# Altium schematic symbol library SCHLIB.SchLib: 2608 symbols (part 19 of 20)
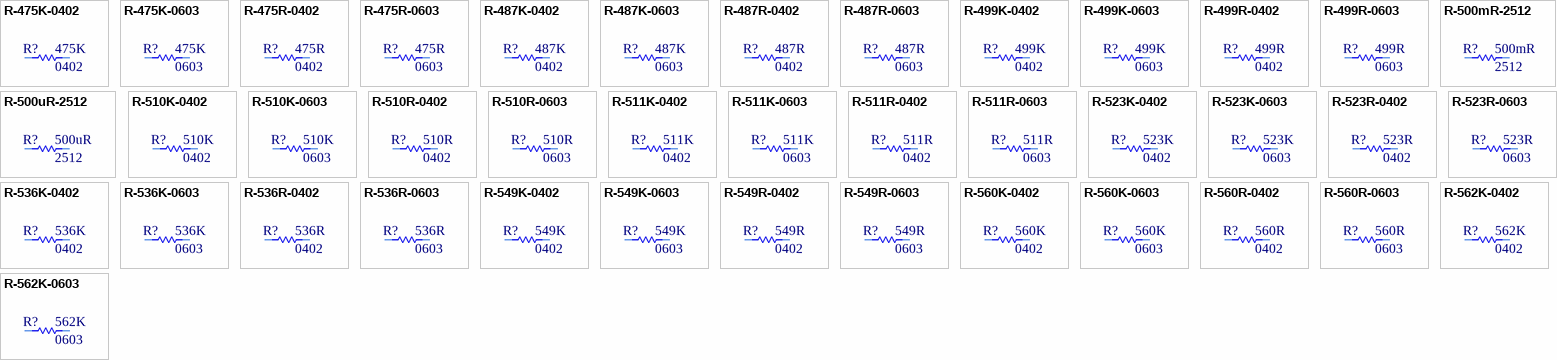
[diagram p101: symbols R-475K-0402 to R-562K-0603]

## R-511R-0603
designator R?, comment Package: 0603  (hidden comment: 511R)
RES SMD 511 OHM 1% 1/10W 0603; Manufacturer Part Number: CRCW0603511RFKEA; Manufacturer: Vishay Dale; Tolerance: 0.01; Power: 0.1W; Temperature Coefficient: ±100ppm/°C; Object  Type: Part; Design Item ID: R-511R-0603; Value: 511R; Composition: Thick Film; Features: Automotive AEC-Q200; Operating Temperature: -55°C ~ 155°C; Height - Seated (Max): 0.50mm; Category: Resistor
footprint R0603
pins: 1, 2

## R-523K-0402
designator R?, comment Package: 0402  (hidden comment: 523K)
RES 523K OHM 1% 1/16W 0402; Manufacturer Part Number: RC0402FR-07523KL; Manufacturer: YAGEO; Tolerance: 0.01; Power: 0.063W; Temperature Coefficient: ±100ppm/°C; Object  Type: Part; Design Item ID: R-523K-0402; Value: 523K; Composition: Thick Film; Features: Moisture Resistant; Operating Temperature: -55°C ~ 155°C; Height - Seated (Max): 0.40mm; Category: Resistor
footprint R0402
pins: 1, 2

## R-523K-0603
designator R?, comment Package: 0603  (hidden comment: 523K)
RES SMD 523K OHM 1% 1/10W 0603; Manufacturer Part Number: CRCW0603523KFKEA; Manufacturer: Vishay Dale; Tolerance: 0.01; Power: 0.1W; Temperature Coefficient: ±100ppm/°C; Object  Type: Part; Design Item ID: R-523K-0603; Value: 523K; Composition: Thick Film; Features: Automotive AEC-Q200; Operating Temperature: -55°C ~ 155°C; Height - Seated (Max): 0.50mm; Category: Resistor
footprint R0603
pins: 1, 2

## R-523R-0402
designator R?, comment Package: 0402  (hidden comment: 523R)
RES 523 OHM 1% 1/16W 0402; Manufacturer Part Number: RC0402FR-07523RL; Manufacturer: YAGEO; Tolerance: 0.01; Power: 0.063W; Temperature Coefficient: ±100ppm/°C; Object  Type: Part; Design Item ID: R-523R-0402; Value: 523R; Composition: Thick Film; Features: Moisture Resistant; Operating Temperature: -55°C ~ 155°C; Height - Seated (Max): 0.40mm; Category: Resistor
footprint R0402
pins: 1, 2

## R-523R-0603
designator R?, comment Package: 0603  (hidden comment: 523R)
RES SMD 523 OHM 1% 1/10W 0603; Manufacturer Part Number: CRCW0603523RFKEA; Manufacturer: Vishay Dale; Tolerance: 0.01; Power: 0.1W; Temperature Coefficient: ±100ppm/°C; Object  Type: Part; Design Item ID: R-523R-0603; Value: 523R; Composition: Thick Film; Features: Automotive AEC-Q200; Operating Temperature: -55°C ~ 155°C; Height - Seated (Max): 0.50mm; Category: Resistor
footprint R0603
pins: 1, 2

## R-536K-0402
designator R?, comment Package: 0402  (hidden comment: 536K)
RES 536K OHM 1% 1/16W 0402; Manufacturer Part Number: RC0402FR-07536KL; Manufacturer: YAGEO; Tolerance: 0.01; Power: 0.063W; Temperature Coefficient: ±100ppm/°C; Object  Type: Part; Design Item ID: R-536K-0402; Value: 536K; Composition: Thick Film; Features: Moisture Resistant; Operating Temperature: -55°C ~ 155°C; Height - Seated (Max): 0.40mm; Category: Resistor
footprint R0402
pins: 1, 2

## R-536K-0603
designator R?, comment Package: 0603  (hidden comment: 536K)
RES SMD 536K OHM 1% 1/10W 0603; Manufacturer Part Number: CRCW0603536KFKEA; Manufacturer: Vishay Dale; Tolerance: 0.01; Power: 0.1W; Temperature Coefficient: ±100ppm/°C; Object  Type: Part; Design Item ID: R-536K-0603; Value: 536K; Composition: Thick Film; Features: Automotive AEC-Q200; Operating Temperature: -55°C ~ 155°C; Height - Seated (Max): 0.50mm; Category: Resistor
footprint R0603
pins: 1, 2

## R-536R-0402
designator R?, comment Package: 0402  (hidden comment: 536R)
RES 536 OHM 1% 1/16W 0402; Manufacturer Part Number: RC0402FR-07536RL; Manufacturer: YAGEO; Tolerance: 0.01; Power: 0.063W; Temperature Coefficient: ±100ppm/°C; Object  Type: Part; Design Item ID: R-536R-0402; Value: 536R; Composition: Thick Film; Features: Moisture Resistant; Operating Temperature: -55°C ~ 155°C; Height - Seated (Max): 0.40mm; Category: Resistor
footprint R0402
pins: 1, 2

## R-536R-0603
designator R?, comment Package: 0603  (hidden comment: 536R)
RES SMD 536 OHM 1% 1/10W 0603; Manufacturer Part Number: CRCW0603536RFKEA; Manufacturer: Vishay Dale; Tolerance: 0.01; Power: 0.1W; Temperature Coefficient: ±100ppm/°C; Object  Type: Part; Design Item ID: R-536R-0603; Value: 536R; Composition: Thick Film; Features: Automotive AEC-Q200; Operating Temperature: -55°C ~ 155°C; Height - Seated (Max): 0.50mm; Category: Resistor
footprint R0603
pins: 1, 2

## R-549K-0402
designator R?, comment Package: 0402  (hidden comment: 549K)
RES 549K OHM 1% 1/16W 0402; Manufacturer Part Number: RC0402FR-07549KL; Manufacturer: YAGEO; Tolerance: 0.01; Power: 0.063W; Temperature Coefficient: ±100ppm/°C; Object  Type: Part; Design Item ID: R-549K-0402; Value: 549K; Composition: Thick Film; Features: Moisture Resistant; Operating Temperature: -55°C ~ 155°C; Height - Seated (Max): 0.40mm; Category: Resistor
footprint R0402
pins: 1, 2

## R-549K-0603
designator R?, comment Package: 0603  (hidden comment: 549K)
RES SMD 549K OHM 1% 1/10W 0603; Manufacturer Part Number: CRCW0603549KFKEA; Manufacturer: Vishay Dale; Tolerance: 0.01; Power: 0.1W; Temperature Coefficient: ±100ppm/°C; Object  Type: Part; Design Item ID: R-549K-0603; Value: 549K; Composition: Thick Film; Features: Automotive AEC-Q200; Operating Temperature: -55°C ~ 155°C; Height - Seated (Max): 0.50mm; Category: Resistor
footprint R0603
pins: 1, 2

## R-549R-0402
designator R?, comment Package: 0402  (hidden comment: 549R)
RES 549 OHM 1% 1/16W 0402; Manufacturer Part Number: RC0402FR-07549RL; Manufacturer: YAGEO; Tolerance: 0.01; Power: 0.063W; Temperature Coefficient: ±100ppm/°C; Object  Type: Part; Design Item ID: R-549R-0402; Composition: Thick Film; Features: Moisture Resistant; Operating Temperature: -55°C ~ 155°C; Height - Seated (Max): 0.40mm; Category: Resistor; Value: 549R
footprint R0402
pins: 1, 2

## R-549R-0603
designator R?, comment Package: 0603  (hidden comment: 549R)
RES SMD 549 OHM 1% 1/10W 0603; Manufacturer Part Number: CRCW0603549RFKEA; Manufacturer: Vishay Dale; Tolerance: 0.01; Power: 0.1W; Temperature Coefficient: ±100ppm/°C; Object  Type: Part; Design Item ID: R-549R-0603; Value: 549R; Composition: Thick Film; Features: Automotive AEC-Q200; Operating Temperature: -55°C ~ 155°C; Height - Seated (Max): 0.50mm; Category: Resistor
footprint R0603
pins: 1, 2

## R-560K-0402
designator R?, comment Package: 0402  (hidden comment: 560K)
RES 560K OHM 1% 1/16W 0402; Manufacturer Part Number: RC0402FR-07560KL; Manufacturer: YAGEO; Tolerance: 0.01; Power: 0.063W; Temperature Coefficient: ±100ppm/°C; Object  Type: Part; Design Item ID: R-560K-0402; Value: 560K; Composition: Thick Film; Features: Moisture Resistant; Operating Temperature: -55°C ~ 155°C; Height - Seated (Max): 0.40mm; Category: Resistor
footprint R0402
pins: 1, 2

## R-560K-0603
designator R?, comment Package: 0603  (hidden comment: 560K)
RES SMD 560K OHM 1% 1/10W 0603; Manufacturer Part Number: CRCW0603560KFKEA; Manufacturer: Vishay Dale; Tolerance: 0.01; Power: 0.1W; Temperature Coefficient: ±100ppm/°C; Object  Type: Part; Design Item ID: R-560K-0603; Value: 560K; Composition: Thick Film; Features: Automotive AEC-Q200; Operating Temperature: -55°C ~ 155°C; Height - Seated (Max): 0.50mm; Category: Resistor
footprint R0603
pins: 1, 2

## R-560R-0402
designator R?, comment Package: 0402  (hidden comment: 560R)
RES 560 OHM 1% 1/16W 0402; Manufacturer Part Number: RC0402FR-07560RL; Manufacturer: YAGEO; Tolerance: 0.01; Power: 0.063W; Temperature Coefficient: ±100ppm/°C; Object  Type: Part; Design Item ID: R-560R-0402; Value: 560R; Composition: Thick Film; Features: Moisture Resistant; Operating Temperature: -55°C ~ 155°C; Height - Seated (Max): 0.40mm; Category: Resistor
footprint R0402
pins: 1, 2

## R-560R-0603
designator R?, comment Package: 0603  (hidden comment: 560R)
RES SMD 560 OHM 1% 1/10W 0603; Manufacturer Part Number: CRCW0603560RFKEA; Manufacturer: Vishay Dale; Tolerance: 0.01; Power: 0.1W; Temperature Coefficient: ±100ppm/°C; Object  Type: Part; Design Item ID: R-560R-0603; Value: 560R; Composition: Thick Film; Features: Automotive AEC-Q200; Operating Temperature: -55°C ~ 155°C; Height - Seated (Max): 0.50mm; Category: Resistor
footprint R0603
pins: 1, 2

## R-562K-0402
designator R?, comment Package: 0402  (hidden comment: 562K)
RES 562K OHM 1% 1/16W 0402; Manufacturer Part Number: RC0402FR-07562KL; Manufacturer: YAGEO; Tolerance: 0.01; Power: 0.063W; Temperature Coefficient: ±100ppm/°C; Object  Type: Part; Design Item ID: R-562K-0402; Value: 562K; Composition: Thick Film; Features: Moisture Resistant; Operating Temperature: -55°C ~ 155°C; Height - Seated (Max): 0.40mm; Category: Resistor
footprint R0402
pins: 1, 2

## R-562K-0603
designator R?, comment Package: 0603  (hidden comment: 562K)
RES SMD 562K OHM 1% 1/10W 0603; Manufacturer Part Number: CRCW0603562KFKEA; Manufacturer: Vishay Dale; Tolerance: 0.01; Power: 0.1W; Temperature Coefficient: ±100ppm/°C; Object  Type: Part; Design Item ID: R-562K-0603; Value: 562K; Composition: Thick Film; Features: Automotive AEC-Q200; Operating Temperature: -55°C ~ 155°C; Height - Seated (Max): 0.50mm; Category: Resistor
footprint R0603
pins: 1, 2

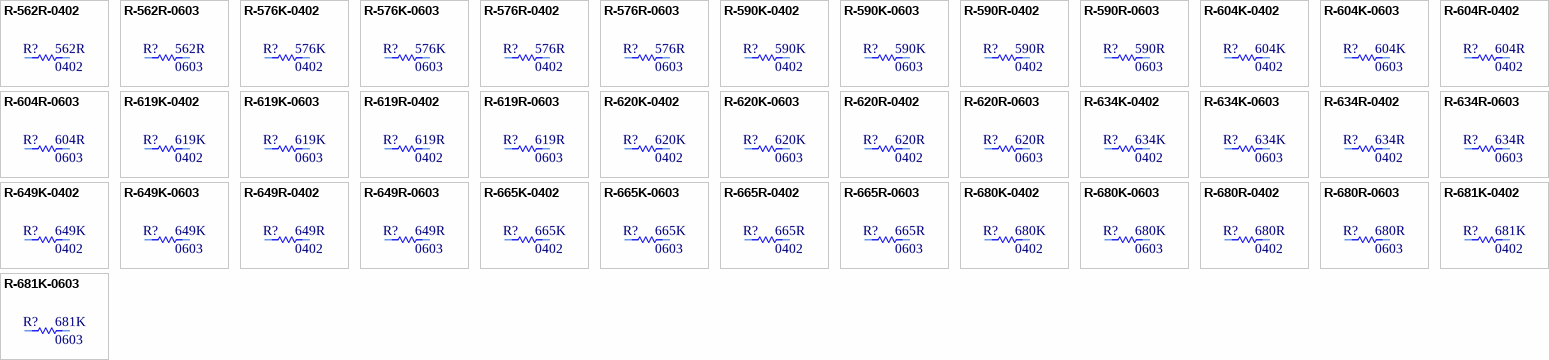
[diagram p79: symbols R-562R-0402 to R-681K-0603]

## R-562R-0402
designator R?, comment Package: 0402  (hidden comment: 562R)
RES 562 OHM 1% 1/16W 0402; Manufacturer Part Number: RC0402FR-07562RL; Manufacturer: YAGEO; Tolerance: 0.01; Power: 0.063W; Temperature Coefficient: ±100ppm/°C; Object  Type: Part; Design Item ID: R-562R-0402; Value: 562R; Composition: Thick Film; Features: Moisture Resistant; Operating Temperature: -55°C ~ 155°C; Height - Seated (Max): 0.40mm; Category: Resistor
footprint R0402
pins: 1, 2

## R-562R-0603
designator R?, comment Package: 0603  (hidden comment: 562R)
RES SMD 562 OHM 1% 1/10W 0603; Manufacturer Part Number: CRCW0603562RFKEA; Manufacturer: Vishay Dale; Tolerance: 0.01; Power: 0.1W; Temperature Coefficient: ±100ppm/°C; Object  Type: Part; Design Item ID: R-562R-0603; Value: 562R; Composition: Thick Film; Features: Automotive AEC-Q200; Operating Temperature: -55°C ~ 155°C; Height - Seated (Max): 0.50mm; Category: Resistor
footprint R0603
pins: 1, 2

## R-576K-0402
designator R?, comment Package: 0402  (hidden comment: 576K)
RES 576K OHM 1% 1/16W 0402; Manufacturer Part Number: RC0402FR-07576KL; Manufacturer: YAGEO; Tolerance: 0.01; Power: 0.063W; Temperature Coefficient: ±100ppm/°C; Object  Type: Part; Design Item ID: R-576K-0402; Value: 576K; Composition: Thick Film; Features: Moisture Resistant; Operating Temperature: -55°C ~ 155°C; Height - Seated (Max): 0.40mm; Category: Resistor
footprint R0402
pins: 1, 2

## R-576K-0603
designator R?, comment Package: 0603  (hidden comment: 576K)
RES SMD 576K OHM 1% 1/10W 0603; Manufacturer Part Number: CRCW0603576KFKEA; Manufacturer: Vishay Dale; Tolerance: 0.01; Power: 0.1W; Temperature Coefficient: ±100ppm/°C; Object  Type: Part; Design Item ID: R-576K-0603; Value: 576K; Composition: Thick Film; Features: Automotive AEC-Q200; Operating Temperature: -55°C ~ 155°C; Height - Seated (Max): 0.50mm; Category: Resistor
footprint R0603
pins: 1, 2

## R-576R-0402
designator R?, comment Package: 0402  (hidden comment: 576R)
RES 576 OHM 1% 1/16W 0402; Manufacturer Part Number: RC0402FR-07576RL; Manufacturer: YAGEO; Tolerance: 0.01; Power: 0.063W; Temperature Coefficient: ±100ppm/°C; Object  Type: Part; Design Item ID: R-576R-0402; Value: 576R; Composition: Thick Film; Features: Moisture Resistant; Operating Temperature: -55°C ~ 155°C; Height - Seated (Max): 0.40mm; Category: Resistor
footprint R0402
pins: 1, 2

## R-576R-0603
designator R?, comment Package: 0603  (hidden comment: 576R)
RES SMD 576 OHM 1% 1/10W 0603; Manufacturer Part Number: CRCW0603576RFKEA; Manufacturer: Vishay Dale; Tolerance: 0.01; Power: 0.1W; Temperature Coefficient: ±100ppm/°C; Object  Type: Part; Design Item ID: R-576R-0603; Value: 576R; Composition: Thick Film; Features: Automotive AEC-Q200; Operating Temperature: -55°C ~ 155°C; Height - Seated (Max): 0.50mm; Category: Resistor
footprint R0603
pins: 1, 2

## R-590K-0402
designator R?, comment Package: 0402  (hidden comment: 590K)
RES 590K OHM 1% 1/16W 0402; Manufacturer Part Number: RC0402FR-07590KL; Manufacturer: YAGEO; Tolerance: 0.01; Power: 0.063W; Temperature Coefficient: ±100ppm/°C; Object  Type: Part; Design Item ID: R-590K-0402; Value: 590K; Composition: Thick Film; Features: Moisture Resistant; Operating Temperature: -55°C ~ 155°C; Height - Seated (Max): 0.40mm; Category: Resistor
footprint R0402
pins: 1, 2

## R-590K-0603
designator R?, comment Package: 0603  (hidden comment: 590K)
RES SMD 590K OHM 1% 1/10W 0603; Manufacturer Part Number: CRCW0603590KFKEA; Manufacturer: Vishay Dale; Tolerance: 0.01; Power: 0.1W; Temperature Coefficient: ±100ppm/°C; Object  Type: Part; Design Item ID: R-590K-0603; Value: 590K; Composition: Thick Film; Features: Automotive AEC-Q200; Operating Temperature: -55°C ~ 155°C; Height - Seated (Max): 0.50mm; Category: Resistor
footprint R0603
pins: 1, 2

## R-590R-0402
designator R?, comment Package: 0402  (hidden comment: 590R)
RES 590 OHM 1% 1/16W 0402; Manufacturer Part Number: RC0402FR-07590RL; Manufacturer: YAGEO; Tolerance: 0.01; Power: 0.063W; Temperature Coefficient: ±100ppm/°C; Object  Type: Part; Design Item ID: R-590R-0402; Value: 590R; Composition: Thick Film; Features: Moisture Resistant; Operating Temperature: -55°C ~ 155°C; Height - Seated (Max): 0.40mm; Category: Resistor
footprint R0402
pins: 1, 2

## R-590R-0603
designator R?, comment Package: 0603  (hidden comment: 590R)
RES SMD 590 OHM 1% 1/10W 0603; Manufacturer Part Number: CRCW0603590RFKEA; Manufacturer: Vishay Dale; Tolerance: 0.01; Power: 0.1W; Temperature Coefficient: ±100ppm/°C; Object  Type: Part; Design Item ID: R-590R-0603; Value: 590R; Composition: Thick Film; Features: Automotive AEC-Q200; Operating Temperature: -55°C ~ 155°C; Height - Seated (Max): 0.50mm; Category: Resistor
footprint R0603
pins: 1, 2

## R-604K-0402
designator R?, comment Package: 0402  (hidden comment: 604K)
RES 604K OHM 1% 1/16W 0402; Manufacturer Part Number: RC0402FR-07604KL; Manufacturer: YAGEO; Tolerance: 0.01; Power: 0.063W; Temperature Coefficient: ±100ppm/°C; Object  Type: Part; Design Item ID: R-604K-0402; Composition: Thick Film; Features: Moisture Resistant; Operating Temperature: -55°C ~ 155°C; Height - Seated (Max): 0.40mm; Category: Resistor; Value: 604K
footprint R0402
pins: 1, 2

## R-604K-0603
designator R?, comment Package: 0603  (hidden comment: 604K)
RES SMD 604K OHM 1% 1/10W 0603; Manufacturer Part Number: CRCW0603604KFKEA; Manufacturer: Vishay Dale; Tolerance: 0.01; Power: 0.1W; Temperature Coefficient: ±100ppm/°C; Object  Type: Part; Design Item ID: R-604K-0603; Value: 604K; Composition: Thick Film; Features: Automotive AEC-Q200; Operating Temperature: -55°C ~ 155°C; Height - Seated (Max): 0.50mm; Category: Resistor
footprint R0603
pins: 1, 2

## R-604R-0402
designator R?, comment Package: 0402  (hidden comment: 604R)
RES 604 OHM 1% 1/16W 0402; Manufacturer Part Number: RC0402FR-07604RL; Manufacturer: YAGEO; Tolerance: 0.01; Power: 0.063W; Temperature Coefficient: ±100ppm/°C; Object  Type: Part; Design Item ID: R-604R-0402; Value: 604R; Composition: Thick Film; Features: Moisture Resistant; Operating Temperature: -55°C ~ 155°C; Height - Seated (Max): 0.40mm; Category: Resistor
footprint R0402
pins: 1, 2

## R-604R-0603
designator R?, comment Package: 0603  (hidden comment: 604R)
RES SMD 604 OHM 1% 1/10W 0603; Manufacturer Part Number: CRCW0603604RFKEA; Manufacturer: Vishay Dale; Tolerance: 0.01; Power: 0.1W; Temperature Coefficient: ±100ppm/°C; Object  Type: Part; Design Item ID: R-604R-0603; Value: 604R; Composition: Thick Film; Features: Automotive AEC-Q200; Operating Temperature: -55°C ~ 155°C; Height - Seated (Max): 0.50mm; Category: Resistor
footprint R0603
pins: 1, 2

## R-619K-0402
designator R?, comment Package: 0402  (hidden comment: 619K)
RES 619K OHM 1% 1/16W 0402; Manufacturer Part Number: RC0402FR-07619KL; Manufacturer: YAGEO; Tolerance: 0.01; Power: 0.063W; Temperature Coefficient: ±100ppm/°C; Object  Type: Part; Design Item ID: R-619K-0402; Value: 619K; Composition: Thick Film; Features: Moisture Resistant; Operating Temperature: -55°C ~ 155°C; Height - Seated (Max): 0.40mm; Category: Resistor
footprint R0402
pins: 1, 2

## R-619K-0603
designator R?, comment Package: 0603  (hidden comment: 619K)
RES SMD 619K OHM 1% 1/10W 0603; Manufacturer Part Number: CRCW0603619KFKEA; Manufacturer: Vishay Dale; Tolerance: 0.01; Power: 0.1W; Temperature Coefficient: ±100ppm/°C; Object  Type: Part; Design Item ID: R-619K-0603; Value: 619K; Composition: Thick Film; Features: Automotive AEC-Q200; Operating Temperature: -55°C ~ 155°C; Height - Seated (Max): 0.50mm; Category: Resistor
footprint R0603
pins: 1, 2

## R-619R-0402
designator R?, comment Package: 0402  (hidden comment: 619R)
RES 619 OHM 1% 1/16W 0402; Manufacturer Part Number: RC0402FR-07619RL; Manufacturer: YAGEO; Tolerance: 0.01; Power: 0.063W; Temperature Coefficient: ±100ppm/°C; Object  Type: Part; Design Item ID: R-619R-0402; Value: 619R; Composition: Thick Film; Features: Moisture Resistant; Operating Temperature: -55°C ~ 155°C; Height - Seated (Max): 0.40mm; Category: Resistor
footprint R0402
pins: 1, 2

## R-619R-0603
designator R?, comment Package: 0603  (hidden comment: 619R)
RES SMD 619 OHM 1% 1/10W 0603; Manufacturer Part Number: CRCW0603619RFKEA; Manufacturer: Vishay Dale; Tolerance: 0.01; Power: 0.1W; Temperature Coefficient: ±100ppm/°C; Object  Type: Part; Design Item ID: R-619R-0603; Value: 619R; Composition: Thick Film; Features: Automotive AEC-Q200; Operating Temperature: -55°C ~ 155°C; Height - Seated (Max): 0.50mm; Category: Resistor
footprint R0603
pins: 1, 2

## R-620K-0402
designator R?, comment Package: 0402  (hidden comment: 620K)
RES 620K OHM 1% 1/16W 0402; Manufacturer Part Number: RC0402FR-07620KL; Manufacturer: YAGEO; Tolerance: 0.01; Power: 0.063W; Temperature Coefficient: ±100ppm/°C; Object  Type: Part; Design Item ID: R-620K-0402; Value: 620K; Composition: Thick Film; Features: Moisture Resistant; Operating Temperature: -55°C ~ 155°C; Height - Seated (Max): 0.40mm; Category: Resistor
footprint R0402
pins: 1, 2

## R-620K-0603
designator R?, comment Package: 0603  (hidden comment: 620K)
RES SMD 620K OHM 1% 1/10W 0603; Manufacturer Part Number: CRCW0603620KFKEA; Manufacturer: Vishay Dale; Tolerance: 0.01; Power: 0.1W; Temperature Coefficient: ±100ppm/°C; Object  Type: Part; Design Item ID: R-620K-0603; Value: 620K; Composition: Thick Film; Features: Automotive AEC-Q200; Operating Temperature: -55°C ~ 155°C; Height - Seated (Max): 0.50mm; Category: Resistor
footprint R0603
pins: 1, 2

## R-620R-0402
designator R?, comment Package: 0402  (hidden comment: 620R)
RES 620 OHM 1% 1/16W 0402; Manufacturer Part Number: RC0402FR-07620RL; Manufacturer: YAGEO; Tolerance: 0.01; Power: 0.063W; Temperature Coefficient: ±100ppm/°C; Object  Type: Part; Design Item ID: R-620R-0402; Value: 620R; Composition: Thick Film; Features: Moisture Resistant; Operating Temperature: -55°C ~ 155°C; Height - Seated (Max): 0.40mm; Category: Resistor
footprint R0402
pins: 1, 2

## R-620R-0603
designator R?, comment Package: 0603  (hidden comment: 620R)
RES SMD 620 OHM 1% 1/10W 0603; Manufacturer Part Number: CRCW0603620RFKEA; Manufacturer: Vishay Dale; Tolerance: 0.01; Power: 0.1W; Temperature Coefficient: ±100ppm/°C; Object  Type: Part; Design Item ID: R-620R-0603; Value: 620R; Composition: Thick Film; Features: Automotive AEC-Q200; Operating Temperature: -55°C ~ 155°C; Height - Seated (Max): 0.50mm; Category: Resistor
footprint R0603
pins: 1, 2

## R-634K-0402
designator R?, comment Package: 0402  (hidden comment: 634K)
RES 634K OHM 1% 1/16W 0402; Manufacturer Part Number: RC0402FR-07634KL; Manufacturer: YAGEO; Tolerance: 0.01; Power: 0.063W; Temperature Coefficient: ±100ppm/°C; Object  Type: Part; Design Item ID: R-634K-0402; Value: 634K; Composition: Thick Film; Features: Moisture Resistant; Operating Temperature: -55°C ~ 155°C; Height - Seated (Max): 0.40mm; Category: Resistor
footprint R0402
pins: 1, 2

## R-634K-0603
designator R?, comment Package: 0603  (hidden comment: 634K)
RES SMD 634K OHM 1% 1/10W 0603; Manufacturer Part Number: CRCW0603634KFKEA; Manufacturer: Vishay Dale; Tolerance: 0.01; Power: 0.1W; Temperature Coefficient: ±100ppm/°C; Object  Type: Part; Design Item ID: R-634K-0603; Value: 634K; Composition: Thick Film; Features: Automotive AEC-Q200; Operating Temperature: -55°C ~ 155°C; Height - Seated (Max): 0.50mm; Category: Resistor
footprint R0603
pins: 1, 2

## R-634R-0402
designator R?, comment Package: 0402  (hidden comment: 634R)
RES 634 OHM 1% 1/16W 0402; Manufacturer Part Number: RC0402FR-07634RL; Manufacturer: YAGEO; Tolerance: 0.01; Power: 0.063W; Temperature Coefficient: ±100ppm/°C; Object  Type: Part; Design Item ID: R-634R-0402; Value: 634R; Composition: Thick Film; Features: Moisture Resistant; Operating Temperature: -55°C ~ 155°C; Height - Seated (Max): 0.40mm; Category: Resistor
footprint R0402
pins: 1, 2

## R-634R-0603
designator R?, comment Package: 0603  (hidden comment: 634R)
RES SMD 634 OHM 1% 1/10W 0603; Manufacturer Part Number: CRCW0603634RFKEA; Manufacturer: Vishay Dale; Tolerance: 0.01; Power: 0.1W; Temperature Coefficient: ±100ppm/°C; Object  Type: Part; Design Item ID: R-634R-0603; Composition: Thick Film; Features: Automotive AEC-Q200; Operating Temperature: -55°C ~ 155°C; Height - Seated (Max): 0.50mm; Category: Resistor; Value: 634R
footprint R0603
pins: 1, 2

## R-649K-0402
designator R?, comment Package: 0402  (hidden comment: 649K)
RES 649K OHM 1% 1/16W 0402; Manufacturer Part Number: RC0402FR-07649KL; Manufacturer: YAGEO; Tolerance: 0.01; Power: 0.063W; Temperature Coefficient: ±100ppm/°C; Object  Type: Part; Design Item ID: R-649K-0402; Value: 649K; Composition: Thick Film; Features: Moisture Resistant; Operating Temperature: -55°C ~ 155°C; Height - Seated (Max): 0.40mm; Category: Resistor
footprint R0402
pins: 1, 2

## R-649K-0603
designator R?, comment Package: 0603  (hidden comment: 649K)
RES SMD 649K OHM 1% 1/10W 0603; Manufacturer Part Number: CRCW0603649KFKEA; Manufacturer: Vishay Dale; Tolerance: 0.01; Power: 0.1W; Temperature Coefficient: ±100ppm/°C; Object  Type: Part; Design Item ID: R-649K-0603; Value: 649K; Composition: Thick Film; Features: Automotive AEC-Q200; Operating Temperature: -55°C ~ 155°C; Height - Seated (Max): 0.50mm; Category: Resistor
footprint R0603
pins: 1, 2

## R-649R-0402
designator R?, comment Package: 0402  (hidden comment: 649R)
RES 649 OHM 1% 1/16W 0402; Manufacturer Part Number: RC0402FR-07649RL; Manufacturer: YAGEO; Tolerance: 0.01; Power: 0.063W; Temperature Coefficient: ±100ppm/°C; Object  Type: Part; Design Item ID: R-649R-0402; Value: 649R; Composition: Thick Film; Features: Moisture Resistant; Operating Temperature: -55°C ~ 155°C; Height - Seated (Max): 0.40mm; Category: Resistor
footprint R0402
pins: 1, 2

## R-649R-0603
designator R?, comment Package: 0603  (hidden comment: 649R)
RES SMD 649 OHM 1% 1/10W 0603; Manufacturer Part Number: CRCW0603649RFKEA; Manufacturer: Vishay Dale; Tolerance: 0.01; Power: 0.1W; Temperature Coefficient: ±100ppm/°C; Object  Type: Part; Design Item ID: R-649R-0603; Value: 649R; Composition: Thick Film; Features: Automotive AEC-Q200; Operating Temperature: -55°C ~ 155°C; Height - Seated (Max): 0.50mm; Category: Resistor
footprint R0603
pins: 1, 2

## R-665K-0402
designator R?, comment Package: 0402  (hidden comment: 665K)
RES 665K OHM 1% 1/16W 0402; Manufacturer Part Number: RC0402FR-07665KL; Manufacturer: YAGEO; Tolerance: 0.01; Power: 0.063W; Temperature Coefficient: ±100ppm/°C; Object  Type: Part; Design Item ID: R-665K-0402; Value: 665K; Composition: Thick Film; Features: Moisture Resistant; Operating Temperature: -55°C ~ 155°C; Height - Seated (Max): 0.40mm; Category: Resistor
footprint R0402
pins: 1, 2

## R-665K-0603
designator R?, comment Package: 0603  (hidden comment: 665K)
RES SMD 665K OHM 1% 1/10W 0603; Manufacturer Part Number: CRCW0603665KFKEA; Manufacturer: Vishay Dale; Tolerance: 0.01; Power: 0.1W; Temperature Coefficient: ±100ppm/°C; Object  Type: Part; Design Item ID: R-665K-0603; Value: 665K; Composition: Thick Film; Features: Automotive AEC-Q200; Operating Temperature: -55°C ~ 155°C; Height - Seated (Max): 0.50mm; Category: Resistor
footprint R0603
pins: 1, 2

## R-665R-0402
designator R?, comment Package: 0402  (hidden comment: 665R)
RES 665 OHM 1% 1/16W 0402; Manufacturer Part Number: RC0402FR-07665RL; Manufacturer: YAGEO; Tolerance: 0.01; Power: 0.063W; Temperature Coefficient: ±100ppm/°C; Object  Type: Part; Design Item ID: R-665R-0402; Value: 665R; Composition: Thick Film; Features: Moisture Resistant; Operating Temperature: -55°C ~ 155°C; Height - Seated (Max): 0.40mm; Category: Resistor
footprint R0402
pins: 1, 2

## R-665R-0603
designator R?, comment Package: 0603  (hidden comment: 665R)
RES SMD 665 OHM 1% 1/10W 0603; Manufacturer Part Number: CRCW0603665RFKEA; Manufacturer: Vishay Dale; Tolerance: 0.01; Power: 0.1W; Temperature Coefficient: ±100ppm/°C; Object  Type: Part; Design Item ID: R-665R-0603; Value: 665R; Composition: Thick Film; Features: Automotive AEC-Q200; Operating Temperature: -55°C ~ 155°C; Height - Seated (Max): 0.50mm; Category: Resistor
footprint R0603
pins: 1, 2

## R-680K-0402
designator R?, comment Package: 0402  (hidden comment: 680K)
RES 680K OHM 1% 1/16W 0402; Manufacturer Part Number: RC0402FR-07680KL; Manufacturer: YAGEO; Tolerance: 0.01; Power: 0.063W; Temperature Coefficient: ±100ppm/°C; Object  Type: Part; Design Item ID: R-680K-0402; Value: 680K; Composition: Thick Film; Features: Moisture Resistant; Operating Temperature: -55°C ~ 155°C; Height - Seated (Max): 0.40mm; Category: Resistor
footprint R0402
pins: 1, 2

## R-680K-0603
designator R?, comment Package: 0603  (hidden comment: 680K)
RES SMD 680K OHM 1% 1/10W 0603; Manufacturer Part Number: CRCW0603680KFKEA; Manufacturer: Vishay Dale; Tolerance: 0.01; Power: 0.1W; Temperature Coefficient: ±100ppm/°C; Object  Type: Part; Design Item ID: R-680K-0603; Value: 680K; Composition: Thick Film; Features: Automotive AEC-Q200; Operating Temperature: -55°C ~ 155°C; Height - Seated (Max): 0.50mm; Category: Resistor
footprint R0603
pins: 1, 2

## R-680R-0402
designator R?, comment Package: 0402  (hidden comment: 680R)
RES 680 OHM 1% 1/16W 0402; Manufacturer Part Number: RC0402FR-07680RL; Manufacturer: YAGEO; Tolerance: 0.01; Power: 0.063W; Temperature Coefficient: ±100ppm/°C; Object  Type: Part; Design Item ID: R-680R-0402; Value: 680R; Composition: Thick Film; Features: Moisture Resistant; Operating Temperature: -55°C ~ 155°C; Height - Seated (Max): 0.40mm; Category: Resistor
footprint R0402
pins: 1, 2

## R-680R-0603
designator R?, comment Package: 0603  (hidden comment: 680R)
RES SMD 680 OHM 1% 1/10W 0603; Manufacturer Part Number: CRCW0603680RFKEA; Manufacturer: Vishay Dale; Tolerance: 0.01; Power: 0.1W; Temperature Coefficient: ±100ppm/°C; Object  Type: Part; Design Item ID: R-680R-0603; Value: 680R; Composition: Thick Film; Features: Automotive AEC-Q200; Operating Temperature: -55°C ~ 155°C; Height - Seated (Max): 0.50mm; Category: Resistor
footprint R0603
pins: 1, 2

## R-681K-0402
designator R?, comment Package: 0402  (hidden comment: 681K)
RES 681K OHM 1% 1/16W 0402; Manufacturer Part Number: RC0402FR-07681KL; Manufacturer: YAGEO; Tolerance: 0.01; Power: 0.063W; Temperature Coefficient: ±100ppm/°C; Object  Type: Part; Design Item ID: R-681K-0402; Value: 681K; Composition: Thick Film; Features: Moisture Resistant; Operating Temperature: -55°C ~ 155°C; Height - Seated (Max): 0.40mm; Category: Resistor
footprint R0402
pins: 1, 2

## R-681K-0603
designator R?, comment Package: 0603  (hidden comment: 681K)
RES SMD 681K OHM 1% 1/10W 0603; Manufacturer Part Number: CRCW0603681KFKEA; Manufacturer: Vishay Dale; Tolerance: 0.01; Power: 0.1W; Temperature Coefficient: ±100ppm/°C; Object  Type: Part; Design Item ID: R-681K-0603; Value: 681K; Composition: Thick Film; Features: Automotive AEC-Q200; Operating Temperature: -55°C ~ 155°C; Height - Seated (Max): 0.50mm; Category: Resistor
footprint R0603
pins: 1, 2

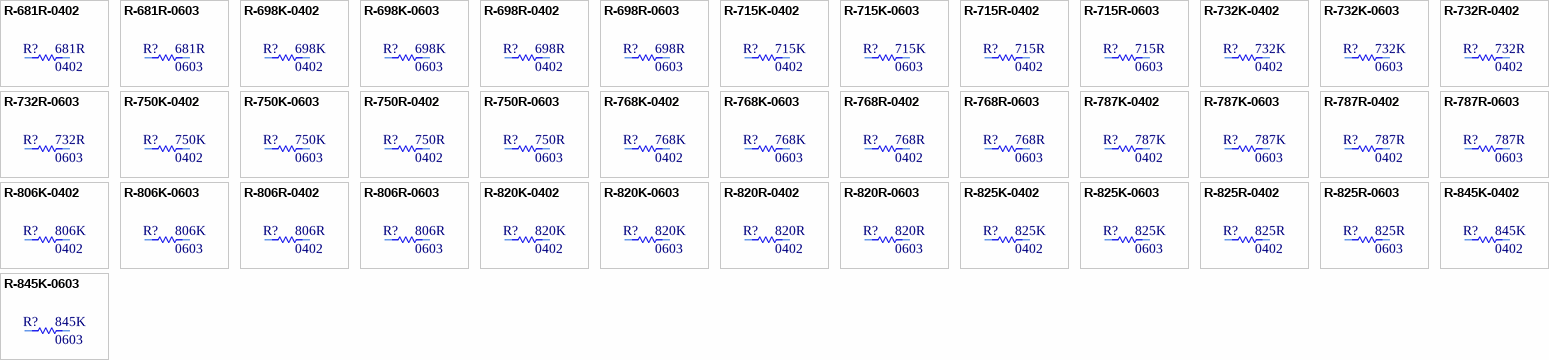
[diagram p80: symbols R-681R-0402 to R-845K-0603]

## R-681R-0402
designator R?, comment Package: 0402  (hidden comment: 681R)
RES 681 OHM 1% 1/16W 0402; Manufacturer Part Number: RC0402FR-07681RL; Manufacturer: YAGEO; Tolerance: 0.01; Power: 0.063W; Temperature Coefficient: ±100ppm/°C; Object  Type: Part; Design Item ID: R-681R-0402; Composition: Thick Film; Features: Moisture Resistant; Operating Temperature: -55°C ~ 155°C; Height - Seated (Max): 0.40mm; Category: Resistor; Value: 681R
footprint R0402
pins: 1, 2

## R-681R-0603
designator R?, comment Package: 0603  (hidden comment: 681R)
RES SMD 681 OHM 1% 1/10W 0603; Manufacturer Part Number: CRCW0603681RFKEA; Manufacturer: Vishay Dale; Tolerance: 0.01; Power: 0.1W; Temperature Coefficient: ±100ppm/°C; Object  Type: Part; Design Item ID: R-681R-0603; Value: 681R; Composition: Thick Film; Features: Automotive AEC-Q200; Operating Temperature: -55°C ~ 155°C; Height - Seated (Max): 0.50mm; Category: Resistor
footprint R0603
pins: 1, 2

## R-698K-0402
designator R?, comment Package: 0402  (hidden comment: 698K)
RES 698K OHM 1% 1/16W 0402; Manufacturer Part Number: RC0402FR-07698KL; Manufacturer: YAGEO; Tolerance: 0.01; Power: 0.063W; Temperature Coefficient: ±100ppm/°C; Object  Type: Part; Design Item ID: R-698K-0402; Value: 698K; Composition: Thick Film; Features: Moisture Resistant; Operating Temperature: -55°C ~ 155°C; Height - Seated (Max): 0.40mm; Category: Resistor
footprint R0402
pins: 1, 2

## R-698K-0603
designator R?, comment Package: 0603  (hidden comment: 698K)
RES SMD 698K OHM 1% 1/10W 0603; Manufacturer Part Number: CRCW0603698KFKEA; Manufacturer: Vishay Dale; Tolerance: 0.01; Power: 0.1W; Temperature Coefficient: ±100ppm/°C; Object  Type: Part; Design Item ID: R-698K-0603; Composition: Thick Film; Features: Automotive AEC-Q200; Operating Temperature: -55°C ~ 155°C; Height - Seated (Max): 0.50mm; Category: Resistor; Value: 698K
footprint R0603
pins: 1, 2

## R-698R-0402
designator R?, comment Package: 0402  (hidden comment: 698R)
RES 698 OHM 1% 1/16W 0402; Manufacturer Part Number: RC0402FR-07698RL; Manufacturer: YAGEO; Tolerance: 0.01; Power: 0.063W; Temperature Coefficient: ±100ppm/°C; Object  Type: Part; Design Item ID: R-698R-0402; Value: 698R; Composition: Thick Film; Features: Moisture Resistant; Operating Temperature: -55°C ~ 155°C; Height - Seated (Max): 0.40mm; Category: Resistor
footprint R0402
pins: 1, 2

## R-698R-0603
designator R?, comment Package: 0603  (hidden comment: 698R)
RES SMD 698 OHM 1% 1/10W 0603; Manufacturer Part Number: CRCW0603698RFKEA; Manufacturer: Vishay Dale; Tolerance: 0.01; Power: 0.1W; Temperature Coefficient: ±100ppm/°C; Object  Type: Part; Design Item ID: R-698R-0603; Value: 698R; Composition: Thick Film; Features: Automotive AEC-Q200; Operating Temperature: -55°C ~ 155°C; Height - Seated (Max): 0.50mm; Category: Resistor
footprint R0603
pins: 1, 2

## R-715K-0402
designator R?, comment Package: 0402  (hidden comment: 715K)
RES 715K OHM 1% 1/16W 0402; Manufacturer Part Number: RC0402FR-07715KL; Manufacturer: YAGEO; Tolerance: 0.01; Power: 0.063W; Temperature Coefficient: ±100ppm/°C; Object  Type: Part; Design Item ID: R-715K-0402; Value: 715K; Composition: Thick Film; Features: Moisture Resistant; Operating Temperature: -55°C ~ 155°C; Height - Seated (Max): 0.40mm; Category: Resistor
footprint R0402
pins: 1, 2

## R-715K-0603
designator R?, comment Package: 0603  (hidden comment: 715K)
RES SMD 715K OHM 1% 1/10W 0603; Manufacturer Part Number: CRCW0603715KFKEA; Manufacturer: Vishay Dale; Tolerance: 0.01; Power: 0.1W; Temperature Coefficient: ±100ppm/°C; Object  Type: Part; Design Item ID: R-715K-0603; Value: 715K; Composition: Thick Film; Features: Automotive AEC-Q200; Operating Temperature: -55°C ~ 155°C; Height - Seated (Max): 0.50mm; Category: Resistor
footprint R0603
pins: 1, 2

## R-715R-0402
designator R?, comment Package: 0402  (hidden comment: 715R)
RES 715 OHM 1% 1/16W 0402; Manufacturer Part Number: RC0402FR-07715RL; Manufacturer: YAGEO; Tolerance: 0.01; Power: 0.063W; Temperature Coefficient: ±100ppm/°C; Object  Type: Part; Design Item ID: R-715R-0402; Value: 715R; Composition: Thick Film; Features: Moisture Resistant; Operating Temperature: -55°C ~ 155°C; Height - Seated (Max): 0.40mm; Category: Resistor
footprint R0402
pins: 1, 2

## R-715R-0603
designator R?, comment Package: 0603  (hidden comment: 715R)
RES SMD 715 OHM 1% 1/10W 0603; Manufacturer Part Number: CRCW0603715RFKEA; Manufacturer: Vishay Dale; Tolerance: 0.01; Power: 0.1W; Temperature Coefficient: ±100ppm/°C; Object  Type: Part; Design Item ID: R-715R-0603; Value: 715R; Composition: Thick Film; Features: Automotive AEC-Q200; Operating Temperature: -55°C ~ 155°C; Height - Seated (Max): 0.50mm; Category: Resistor
footprint R0603
pins: 1, 2

## R-732K-0402
designator R?, comment Package: 0402  (hidden comment: 732K)
RES 732K OHM 1% 1/16W 0402; Manufacturer Part Number: RC0402FR-07732KL; Manufacturer: YAGEO; Tolerance: 0.01; Power: 0.063W; Temperature Coefficient: ±100ppm/°C; Object  Type: Part; Design Item ID: R-732K-0402; Composition: Thick Film; Features: Moisture Resistant; Operating Temperature: -55°C ~ 155°C; Height - Seated (Max): 0.40mm; Category: Resistor; Value: 732K
footprint R0402
pins: 1, 2

## R-732K-0603
designator R?, comment Package: 0603  (hidden comment: 732K)
RES SMD 732K OHM 1% 1/10W 0603; Manufacturer Part Number: CRCW0603732KFKEA; Manufacturer: Vishay Dale; Tolerance: 0.01; Power: 0.1W; Temperature Coefficient: ±100ppm/°C; Object  Type: Part; Design Item ID: R-732K-0603; Value: 732K; Composition: Thick Film; Features: Automotive AEC-Q200; Operating Temperature: -55°C ~ 155°C; Height - Seated (Max): 0.50mm; Category: Resistor
footprint R0603
pins: 1, 2

## R-732R-0402
designator R?, comment Package: 0402  (hidden comment: 732R)
RES 732 OHM 1% 1/16W 0402; Manufacturer Part Number: RC0402FR-07732RL; Manufacturer: YAGEO; Tolerance: 0.01; Power: 0.063W; Temperature Coefficient: ±100ppm/°C; Object  Type: Part; Design Item ID: R-732R-0402; Value: 732R; Composition: Thick Film; Features: Moisture Resistant; Operating Temperature: -55°C ~ 155°C; Height - Seated (Max): 0.40mm; Category: Resistor
footprint R0402
pins: 1, 2

## R-732R-0603
designator R?, comment Package: 0603  (hidden comment: 732R)
RES SMD 732 OHM 1% 1/10W 0603; Manufacturer Part Number: CRCW0603732RFKEA; Manufacturer: Vishay Dale; Tolerance: 0.01; Power: 0.1W; Temperature Coefficient: ±100ppm/°C; Object  Type: Part; Design Item ID: R-732R-0603; Composition: Thick Film; Features: Automotive AEC-Q200; Operating Temperature: -55°C ~ 155°C; Height - Seated (Max): 0.50mm; Category: Resistor; Value: 732R
footprint R0603
pins: 1, 2

## R-750K-0402
designator R?, comment Package: 0402  (hidden comment: 750K)
RES 750K OHM 1% 1/16W 0402; Manufacturer Part Number: RC0402FR-07750KL; Manufacturer: YAGEO; Tolerance: 0.01; Power: 0.063W; Temperature Coefficient: ±100ppm/°C; Object  Type: Part; Design Item ID: R-750K-0402; Value: 750K; Composition: Thick Film; Features: Moisture Resistant; Operating Temperature: -55°C ~ 155°C; Height - Seated (Max): 0.40mm; Category: Resistor
footprint R0402
pins: 1, 2

## R-750K-0603
designator R?, comment Package: 0603  (hidden comment: 750K)
RES SMD 750K OHM 1% 1/10W 0603; Manufacturer Part Number: CRCW0603750KFKEA; Manufacturer: Vishay Dale; Tolerance: 0.01; Power: 0.1W; Temperature Coefficient: ±100ppm/°C; Object  Type: Part; Design Item ID: R-750K-0603; Composition: Thick Film; Features: Automotive AEC-Q200; Operating Temperature: -55°C ~ 155°C; Height - Seated (Max): 0.50mm; Category: Resistor; Value: 750K
footprint R0603
pins: 1, 2

## R-750R-0402
designator R?, comment Package: 0402  (hidden comment: 750R)
RES 750 OHM 1% 1/16W 0402; Manufacturer Part Number: RC0402FR-07750RL; Manufacturer: YAGEO; Tolerance: 0.01; Power: 0.063W; Temperature Coefficient: ±100ppm/°C; Object  Type: Part; Design Item ID: R-750R-0402; Composition: Thick Film; Features: Moisture Resistant; Operating Temperature: -55°C ~ 155°C; Height - Seated (Max): 0.40mm; Category: Resistor; Value: 750R
footprint R0402
pins: 1, 2

## R-750R-0603
designator R?, comment Package: 0603  (hidden comment: 750R)
RES SMD 750 OHM 1% 1/10W 0603; Manufacturer Part Number: CRCW0603750RFKEA; Manufacturer: Vishay Dale; Tolerance: 0.01; Power: 0.1W; Temperature Coefficient: ±100ppm/°C; Object  Type: Part; Design Item ID: R-750R-0603; Value: 750R; Composition: Thick Film; Features: Automotive AEC-Q200; Operating Temperature: -55°C ~ 155°C; Height - Seated (Max): 0.50mm; Category: Resistor
footprint R0603
pins: 1, 2

## R-768K-0402
designator R?, comment Package: 0402  (hidden comment: 768K)
RES 768K OHM 1% 1/16W 0402; Manufacturer Part Number: RC0402FR-07768KL; Manufacturer: YAGEO; Tolerance: 0.01; Power: 0.063W; Temperature Coefficient: ±100ppm/°C; Object  Type: Part; Design Item ID: R-768K-0402; Value: 768K; Composition: Thick Film; Features: Moisture Resistant; Operating Temperature: -55°C ~ 155°C; Height - Seated (Max): 0.40mm; Category: Resistor
footprint R0402
pins: 1, 2

## R-768K-0603
designator R?, comment Package: 0603  (hidden comment: 768K)
RES SMD 768K OHM 1% 1/10W 0603; Manufacturer Part Number: CRCW0603768KFKEA; Manufacturer: Vishay Dale; Tolerance: 0.01; Power: 0.1W; Temperature Coefficient: ±100ppm/°C; Object  Type: Part; Design Item ID: R-768K-0603; Value: 768K; Composition: Thick Film; Features: Automotive AEC-Q200; Operating Temperature: -55°C ~ 155°C; Height - Seated (Max): 0.50mm; Category: Resistor
footprint R0603
pins: 1, 2

## R-768R-0402
designator R?, comment Package: 0402  (hidden comment: 768R)
RES 768 OHM 1% 1/16W 0402; Manufacturer Part Number: RC0402FR-07768RL; Manufacturer: YAGEO; Tolerance: 0.01; Power: 0.063W; Temperature Coefficient: ±100ppm/°C; Object  Type: Part; Design Item ID: R-768R-0402; Composition: Thick Film; Features: Moisture Resistant; Operating Temperature: -55°C ~ 155°C; Height - Seated (Max): 0.40mm; Category: Resistor; Value: 768R
footprint R0402
pins: 1, 2

## R-768R-0603
designator R?, comment Package: 0603  (hidden comment: 768R)
RES SMD 768 OHM 1% 1/10W 0603; Manufacturer Part Number: CRCW0603768RFKEA; Manufacturer: Vishay Dale; Tolerance: 0.01; Power: 0.1W; Temperature Coefficient: ±100ppm/°C; Object  Type: Part; Design Item ID: R-768R-0603; Value: 768R; Composition: Thick Film; Features: Automotive AEC-Q200; Operating Temperature: -55°C ~ 155°C; Height - Seated (Max): 0.50mm; Category: Resistor
footprint R0603
pins: 1, 2

## R-787K-0402
designator R?, comment Package: 0402  (hidden comment: 787K)
RES 787K OHM 1% 1/16W 0402; Manufacturer Part Number: RC0402FR-07787KL; Manufacturer: YAGEO; Tolerance: 0.01; Power: 0.063W; Temperature Coefficient: ±100ppm/°C; Object  Type: Part; Design Item ID: R-787K-0402; Value: 787K; Composition: Thick Film; Features: Moisture Resistant; Operating Temperature: -55°C ~ 155°C; Height - Seated (Max): 0.40mm; Category: Resistor
footprint R0402
pins: 1, 2

## R-787K-0603
designator R?, comment Package: 0603  (hidden comment: 787K)
RES SMD 787K OHM 1% 1/10W 0603; Manufacturer Part Number: CRCW0603787KFKEA; Manufacturer: Vishay Dale; Tolerance: 0.01; Power: 0.1W; Temperature Coefficient: ±100ppm/°C; Object  Type: Part; Design Item ID: R-787K-0603; Value: 787K; Composition: Thick Film; Features: Automotive AEC-Q200; Operating Temperature: -55°C ~ 155°C; Height - Seated (Max): 0.50mm; Category: Resistor
footprint R0603
pins: 1, 2

## R-787R-0402
designator R?, comment Package: 0402  (hidden comment: 787R)
RES 787 OHM 1% 1/16W 0402; Manufacturer Part Number: RC0402FR-07787RL; Manufacturer: YAGEO; Tolerance: 0.01; Power: 0.063W; Temperature Coefficient: ±100ppm/°C; Object  Type: Part; Design Item ID: R-787R-0402; Value: 787R; Composition: Thick Film; Features: Moisture Resistant; Operating Temperature: -55°C ~ 155°C; Height - Seated (Max): 0.40mm; Category: Resistor
footprint R0402
pins: 1, 2

## R-787R-0603
designator R?, comment Package: 0603  (hidden comment: 787R)
RES SMD 787 OHM 1% 1/10W 0603; Manufacturer Part Number: CRCW0603787RFKEA; Manufacturer: Vishay Dale; Tolerance: 0.01; Power: 0.1W; Temperature Coefficient: ±100ppm/°C; Object  Type: Part; Design Item ID: R-787R-0603; Value: 787R; Composition: Thick Film; Features: Automotive AEC-Q200; Operating Temperature: -55°C ~ 155°C; Height - Seated (Max): 0.50mm; Category: Resistor
footprint R0603
pins: 1, 2

## R-806K-0402
designator R?, comment Package: 0402  (hidden comment: 806K)
RES 806K OHM 1% 1/16W 0402; Manufacturer Part Number: RC0402FR-07806KL; Manufacturer: YAGEO; Tolerance: 0.01; Power: 0.063W; Temperature Coefficient: ±100ppm/°C; Object  Type: Part; Design Item ID: R-806K-0402; Value: 806K; Composition: Thick Film; Features: Moisture Resistant; Operating Temperature: -55°C ~ 155°C; Height - Seated (Max): 0.40mm; Category: Resistor
footprint R0402
pins: 1, 2

## R-806K-0603
designator R?, comment Package: 0603  (hidden comment: 806K)